# Altium footprint library cool_library.PcbLib: 1182 footprints (part 56 of 75)
Each footprint in its own frame and in the unit in brackets; x right, y up, seen from the top. Pads: shape width x height; smd on the part's side, far side on the other; paste and mask are expansions set on the pad; w line width, h text height; cw(c..) or ccw(c..) is an arc to the next point about the centre after c.
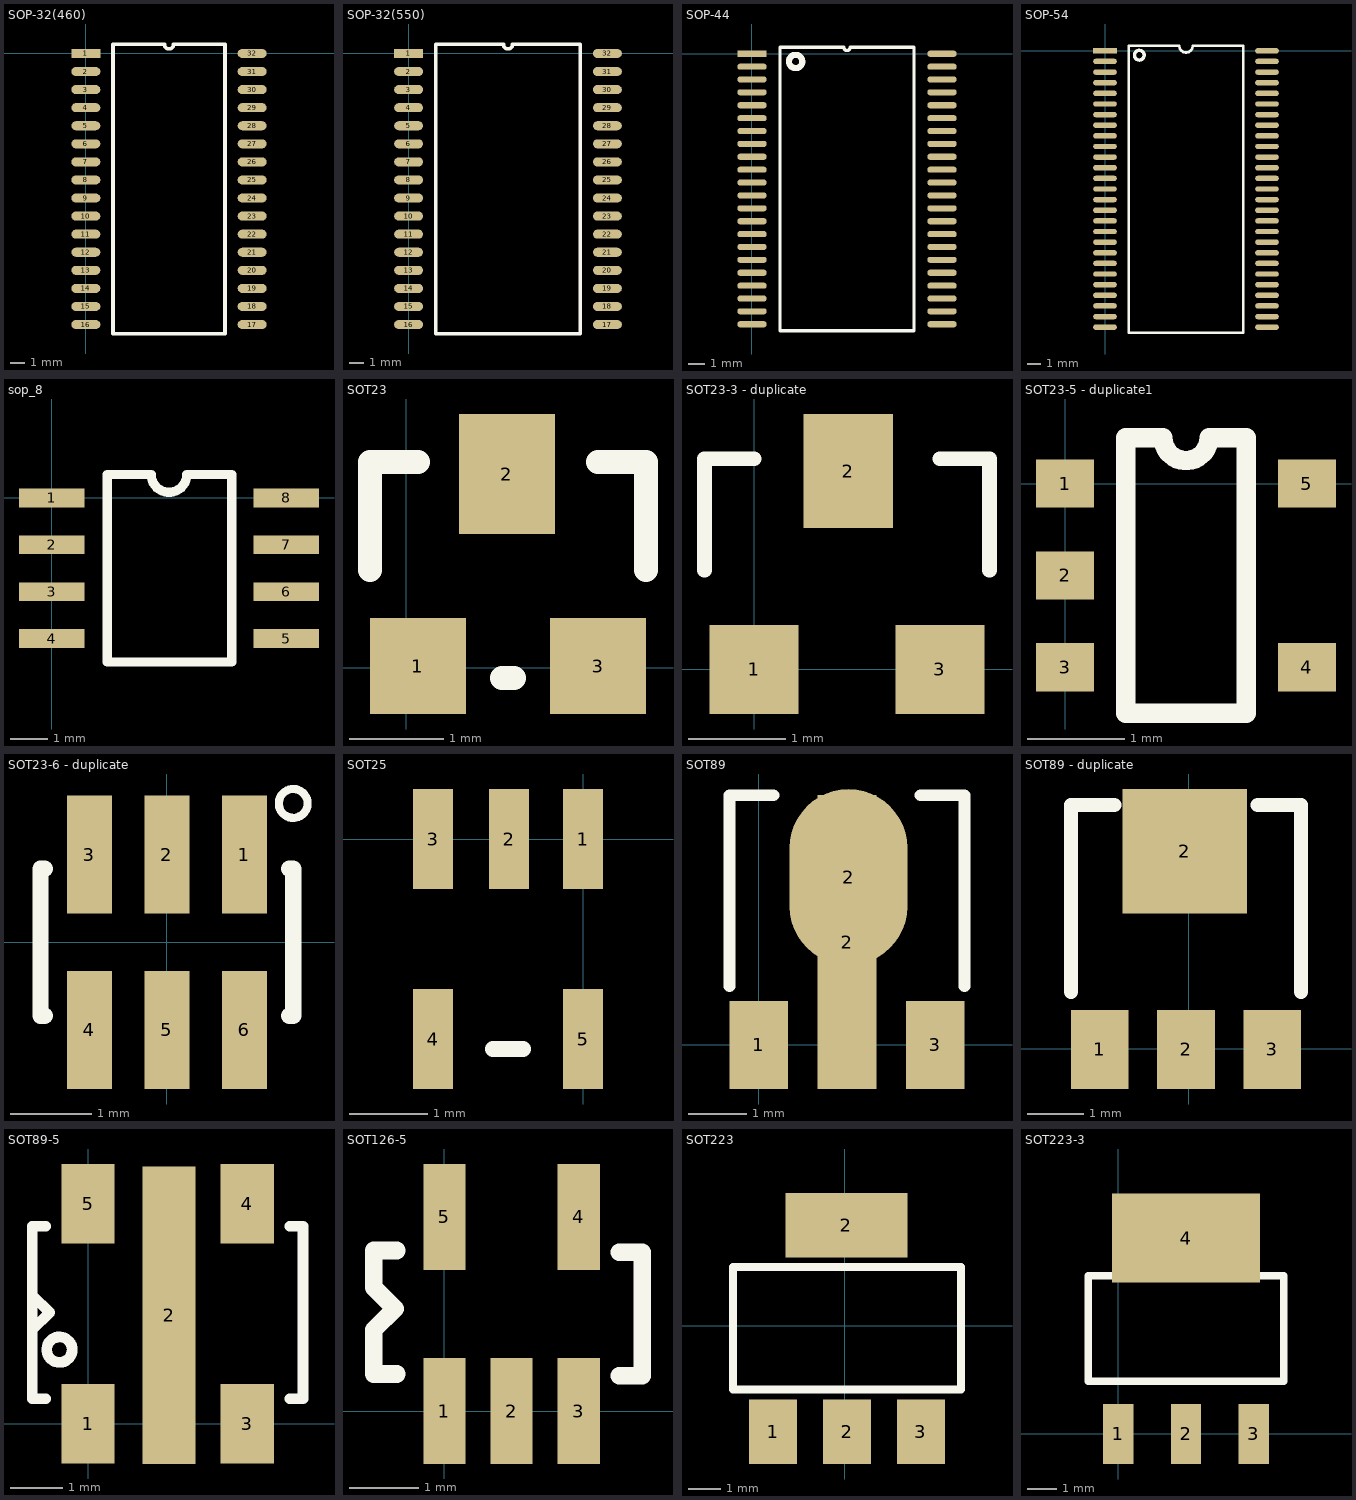
[diagram p55: the footprints below, top view; thin cyan lines are the x and y axes]

## SOP-32(460) [mil]
pads (32):
  rect 80x25 smd: 1(0,0)
  oval 80x25 smd: 2(0,-50) 3(0,-100) 4(0,-150) 5(0,-200) 6(0,-250) 7(0,-300) 8(0,-350) 9(0,-400) 10(0,-450) 11(0,-500) 12(0,-550) 13(0,-600) 14(0,-650) 15(0,-700) 16(0,-750) 17(460,-750) 18(460,-700) 19(460,-650) 20(460,-600) 21(460,-550) 22(460,-500) 23(460,-450) 24(460,-400) 25(460,-350) 26(460,-300) 27(460,-250) 28(460,-200) 29(460,-150) 30(460,-100) 31(460,-50) 32(460,0)
Top Overlay:
  lines w10: 75,-775 385,-775 385,25 242.5,25 cw(c230,25) 217.5,25 75,25 75,-775

## SOP-32(550) [mil]
pads (32):
  rect 80x25 smd: 1(0,0)
  oval 80x25 smd: 2(0,-50) 3(0,-100) 4(0,-150) 5(0,-200) 6(0,-250) 7(0,-300) 8(0,-350) 9(0,-400) 10(0,-450) 11(0,-500) 12(0,-550) 13(0,-600) 14(0,-650) 15(0,-700) 16(0,-750) 17(550,-750) 18(550,-700) 19(550,-650) 20(550,-600) 21(550,-550) 22(550,-500) 23(550,-450) 24(550,-400) 25(550,-350) 26(550,-300) 27(550,-250) 28(550,-200) 29(550,-150) 30(550,-100) 31(550,-50) 32(550,0)
Top Overlay:
  lines w10: 75,-775 475,-775 475,25 287.5,25 cw(c275,25) 262.5,25 75,25 75,-775

## SOP-44 [mil]
pads (44):
  rect 72x15 smd: 1(0,0)
  oval 72x15 smd: 2(0,-31.5) 3(0,-62.99) 4(0,-94.49) 5(0,-125.98) 6(0,-157.48) 7(0,-188.98) 8(0,-220.47) 9(0,-251.97) 10(0,-283.46) 11(0,-314.96) 12(0,-346.46) 13(0,-377.95) 14(0,-409.45) 15(0,-440.94) 16(0,-472.44) 17(0,-503.94) 18(0,-535.43) 19(0,-566.93) 20(0,-598.43) 21(0,-629.92) 22(0,-661.42) 23(464.57,-661.42) 24(464.57,-629.92) 25(464.57,-598.43) 26(464.57,-566.93) 27(464.57,-535.43) 28(464.57,-503.94) 29(464.57,-472.44) 30(464.57,-440.94) 31(464.57,-409.45) 32(464.57,-377.95) 33(464.57,-346.46) 34(464.57,-314.96) 35(464.57,-283.46) 36(464.57,-251.97) 37(464.57,-220.47) 38(464.57,-188.98) 39(464.57,-157.48) 40(464.57,-125.98) 41(464.57,-94.49) 42(464.57,-62.99) 43(464.57,-31.5) 44(464.57,0)
Top Overlay:
  lines w7.87: 68.31,-677.17 396.26,-677.17 396.26,15.75 240.16,15.75 cw(c232.28,15.75) 224.41,15.75 68.31,15.75 68.31,-677.17
  lines w15: 123,-19 cw(c106.69,-19) 122.99,-18.32

## SOP-54 [mil]
pads (54):
  rect 70x16 smd: 1(0,0)
  oval 70x16 smd: 2(0,-31.5) 3(0,-62.99) 4(0,-94.49) 5(0,-125.98) 6(0,-157.48) 7(0,-188.98) 8(0,-220.47) 9(0,-251.97) 10(0,-283.46) 11(0,-314.96) 12(0,-346.46) 13(0,-377.95) 14(0,-409.45) 15(0,-440.94) 16(0,-472.44) 17(0,-503.94) 18(0,-535.43) 19(0,-566.93) 20(0,-598.43) 21(0,-629.92) 22(0,-661.42) 23(0,-692.91) 24(0,-724.41) 25(0,-755.91) 26(0,-787.4) 27(0,-818.9) 28(479.94,-818.9) 29(479.94,-787.4) 30(479.94,-755.91) 31(479.94,-724.41) 32(479.94,-692.91) 33(479.94,-661.42) 34(479.94,-629.92) 35(479.94,-598.43) 36(479.94,-566.93) 37(479.94,-535.43) 38(479.94,-503.94) 39(479.94,-472.44) 40(479.94,-440.94) 41(479.94,-409.45) 42(479.94,-377.95) 43(479.94,-346.46) 44(479.94,-314.96) 45(479.94,-283.46) 46(479.94,-251.97) 47(479.94,-220.47) 48(479.94,-188.98) 49(479.94,-157.48) 50(479.94,-125.98) 51(479.94,-94.49) 52(479.94,-62.99) 53(479.94,-31.5) 54(479.94,0)
Top Overlay:
  circle w10: c101.58,-13 r14.42
  lines w7.87: 70,-835 410,-835 ; 70,15 220,15 ccw(c240,15) 260,15 410,15
  lines w8: 70,-835 70,15 ; 410,-835 410,15

## sop_8 [mil]
pads (8):
  rect 70x20 smd: 1(0,0) 2(0,-50) 3(0,-100) 4(0,-150) 5(250,-150) 6(250,-100) 7(250,-50) 8(250,0)
Top Overlay:
  lines w10: 144,25 cw(c125,25) 106,25 59,25 59,-175 192,-175 192,25 145,25
3D body: height 80, standoff 10, extent 56,-176 192,27

## SOT23 [mil]
pads (3):
  rect 40x40 smd: 1(4.88,0.63) 3(79.88,0.63)
  rect 40x50 smd: 2(41.88,80.63)
Top Overlay:
  lines w10: -15.12,40.63 -15.12,85.63 4.88,85.63 ; 39.88,-4.37 44.88,-4.37 ; 79.88,85.63 99.88,85.63 99.88,40.63
3D body: height 47.24, standoff 0, extent -14.87,-11.02 99.3,99.22

## SOT23-3 - duplicate [mil]
pads (3):
  rect 36x36 smd: 1(0,0) 3(75,0)
  rect 36x46.06 smd: 2(38,80)
Top Overlay:
  lines w5.91: -20,40 -20,85 0,85 ; 75,85 95,85 95,40

## SOT23-5 - duplicate1 [mm]
pads (5):
  rect 0.6x0.5 smd: 1(0,0) 2(0,-0.95) 3(0,-1.9) 4(2.5,-1.9) 5(2.5,0)
Top Overlay:
  lines w0.2: 0.627,-2.375 1.873,-2.375 1.873,0.475 1.488,0.475 cw(c1.25,0.475) 1.013,0.475 0.627,0.475 0.627,-2.375

## SOT23-6 - duplicate [mm] "SOT-23/SC-74A; 5 Leads; Body 3.1 x 3 mm, inc. leads (LxW max)"
height 1.45
pads (6):
  rect 0.55x1.45 smd: 1(0.95,1.075) 2(0,1.075) 3(-0.95,1.075) 4(-0.95,-1.075) 5(0,-1.075) 6(0.95,-1.075)
Top Overlay:
  circle w0.1: c1.549,1.702 r0.177
  lines w0.2: -1.5,-0.9 -1.55,-0.9 -1.55,0.9 -1.5,0.9 ; 1.5,-0.9 1.55,-0.9 1.55,0.9 1.5,0.9
3D body: height 1.08, standoff -0.01, extent -1.397,-1.194 1.397,1.232

## SOT25 [mil]
pads (5):
  rect 20x50 smd: 1(0,0) 2(-37,0) 3(-75,0) 4(-75,-100) 5(0,-100)
Top Overlay:
  lines w8: -45,-105 -30,-105

## SOT89 [mil]
pads (4):
  rect 40x60 smd: 1(0,0) 3(120,0)
  rect 40x200 smd: 2(60,70)
  oval 80x120 smd: 2(61.02,114.17)
Top Overlay:
  lines w8: -20,40 -20,170 10,170 ; 110,170 140,170 140,40

## SOT89 - duplicate [mil]
pads (4):
  rect 40x55 smd: 1(-61.82,-0.57) 2(-1.82,-0.57) 3(58.18,-0.57)
  rect 86.61x86.61 smd: 2(-2.76,137.22)
Top Overlay:
  lines w10: -81.82,39.43 -81.82,169.43 -51.82,169.43 ; 48.18,169.43 78.18,169.43 78.18,39.43
3D body: height 59.45, standoff 0, extent -90.07,-6.45 87.1,162.85

## SOT89-5 [mil]
pads (5):
  rect 40x60 smd: 1(0,0) 3(120,0) 4(120,166) 5(0,166)
  rect 40x224.41 smd: 2(61,82)
Top Overlay:
  circle w8: c-21.61,56 r9.62
  lines w8: -42,71 -29,84 -42,97 ; -32,19 -42,19 -42,149 -32,149 ; 152,19 162,19 162,149 152,149

## SOT126-5 [mil]
pads (5):
  rect 24x60 smd: 1(0,0) 2(38,0) 3(76,0) 4(76,110) 5(0,110)
Top Overlay:
  lines w10: -27,21 -40,21 -40,46 -28,58 -40,70 -40,91 -27,91 ; 99,20 112,20 112,90 99,90

## SOT223 [mil]
pads (4):
  rect 59x79 smd: 1(-88,-130) 2(2.55,-130) 3(93.1,-130)
  rect 150x79 smd: 2(1.88,123.54)
Top Overlay:
  lines w10: -137.45,-78 142.55,-78 142.55,72 -137.45,72 -137.45,-78
3D body: height 66.93, standoff 0, extent -126.41,-138.72 129.5,135.3

## SOT223-3 [mil]
pads (4):
  rect 40x80 smd: 1(0,0) 2(90,0) 3(180,0)
  rect 196.85x118.11 smd: 4(90,260)
Top Overlay:
  lines w10: -40,70 220,70 220,210 -40,210 -40,70